# Altium footprint library c3_PcbLib.PcbLib: 222 footprints (part 10 of 14)
Each footprint in its own frame and in the unit in brackets; x right, y up, seen from the top. Pads: shape width x height; smd on the part's side, far side on the other; paste and mask are expansions set on the pad; w line width, h text height; cw(c..) or ccw(c..) is an arc to the next point about the centre after c.
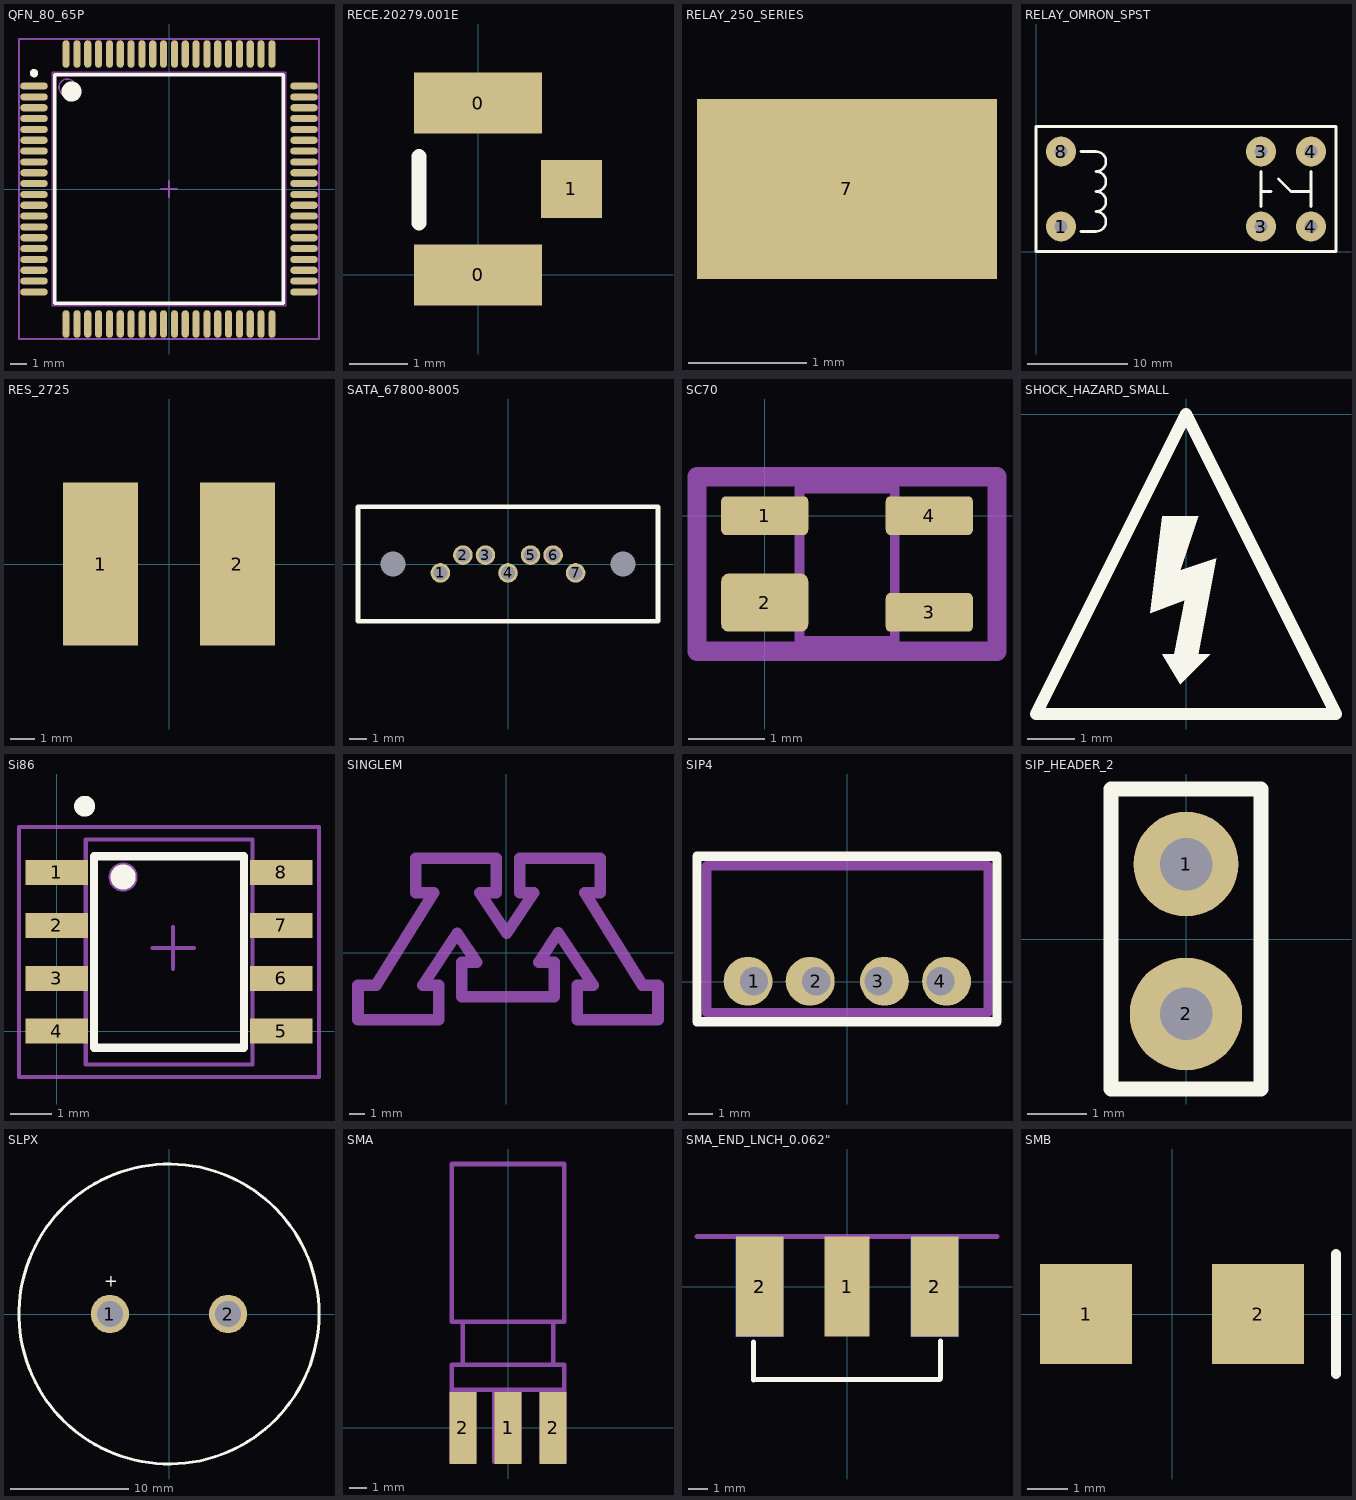
[diagram p9: the footprints below, top view; thin cyan lines are the x and y axes]

## QFN_80_65P [mm]
pads (80):
  oval 1.651x0.432 smd: 1(-8.1,6.175) 2(-8.1,5.525) 3(-8.1,4.875) 4(-8.1,4.225) 5(-8.1,3.575) 6(-8.1,2.925) 7(-8.1,2.275) 8(-8.1,1.625) 9(-8.1,0.975) 10(-8.1,0.325) 11(-8.1,-0.325) 12(-8.1,-0.975) 13(-8.1,-1.625) 14(-8.1,-2.275) 15(-8.1,-2.925) 16(-8.1,-3.575) 17(-8.1,-4.225) 18(-8.1,-4.875) 19(-8.1,-5.525) 20(-8.1,-6.175) 41(8.1,-6.175) 42(8.1,-5.525) 43(8.1,-4.875) 44(8.1,-4.225) 45(8.1,-3.575) 46(8.1,-2.925) 47(8.1,-2.275) 48(8.1,-1.625) 49(8.1,-0.975) 50(8.1,-0.325) 51(8.1,0.325) 52(8.1,0.975) 53(8.1,1.625) 54(8.1,2.275) 55(8.1,2.925) 56(8.1,3.575) 57(8.1,4.225) 58(8.1,4.875) 59(8.1,5.525) 60(8.1,6.175)
  oval 0.432x1.651 smd: 21(-6.175,-8.1) 22(-5.525,-8.1) 23(-4.875,-8.1) 24(-4.225,-8.1) 25(-3.575,-8.1) 26(-2.925,-8.1) 27(-2.275,-8.1) 28(-1.625,-8.1) 29(-0.975,-8.1) 30(-0.325,-8.1) 31(0.325,-8.1) 32(0.975,-8.1) 33(1.625,-8.1) 34(2.275,-8.1) 35(2.925,-8.1) 36(3.575,-8.1) 37(4.225,-8.1) 38(4.875,-8.1) 39(5.525,-8.1) 40(6.175,-8.1) 61(6.175,8.1) 62(5.525,8.1) 63(4.875,8.1) 64(4.225,8.1) 65(3.575,8.1) 66(2.925,8.1) 67(2.275,8.1) 68(1.625,8.1) 69(0.975,8.1) 70(0.325,8.1) 71(-0.325,8.1) 72(-0.975,8.1) 73(-1.625,8.1) 74(-2.275,8.1) 75(-2.925,8.1) 76(-3.575,8.1) 77(-4.225,8.1) 78(-4.875,8.1) 79(-5.525,8.1) 80(-6.175,8.1)
Top Overlay:
  circle w0.6: c-5.85,5.85 r0.3
  circle w0.25: c-8.1,6.95 r0.125
  lines w0.2: -6.85,-6.85 6.85,-6.85 6.85,6.85 -6.85,6.85 -6.85,-6.85
Mechanical 13:
  circle w0.1: c-6.1,6.1 r0.5
  lines w0.1: -7,-7 7,-7 7,7 -7,7 -7,-7
Mechanical 15:
  lines w0.1: -0.5,0 0.5,0 ; 0,-0.5 0,0.5 ; -9,-9 9,-9 9,9 -9,9 -9,-9
3D body: height 2.45, standoff 0, extent -7,-7 7,7

## RECE.20279.001E [mm] "U.FL Connector Footprint"
height 1.25
pads (3):
  rect 2.2x1.05 smd: 0(0,0) 0(0,2.95)
  rect 1.05x1 smd: 1(1.6,1.475)
Top Overlay:
  lines w0.254: -1.016,0.889 -1.016,2.032

## RELAY_250_SERIES [mil] "FOR HG2-DC12V"
pads (1):
  rect 100x60 smd: 7(-136,212)
via -11,371 diameter 50 hole 28
via 171,369 diameter 50 hole 28
via 176,193 diameter 50 hole 28
via 2,190 diameter 50 hole 28
via 3,87 diameter 50 hole 28
via 175,83 diameter 50 hole 28
via 174,4 diameter 50 hole 28
via 2,4 diameter 50 hole 28

## RELAY_OMRON_SPST [mm]
height 15.7
pads (6):
  round 3 hole 1.3: 1(2.5,2.5) 3(22.5,2.5) 3(22.5,10) 4(27.5,2.5) 4(27.5,10) 8(2.5,10)
Top Overlay:
  lines w0.254: 4.5,2 6,2 ccw(c6,3) 6,4 ccw(c6,5) 6,6 ccw(c6,7) 6,8 ccw(c6,9) 6,10 4.5,10 ; 22.5,4.5 22.5,8 ; 22.5,6 23.5,6 ; 24.25,7.25 25.5,6 27.5,6 ; 27.5,4.5 27.5,8 ; 0,0 30,0 30,12.5 0,12.5 0,0

## RES_2725 [mil]
pads (2):
  rect 120x260 smd: 1(-109,0) 2(109,0)

## SATA_67800-8005 [mm]
pads (9):
  round 0 hole 1.4: 0(-6.48,0) 0(6.48,0)
  round 1.1 hole 0.8: 1(-3.81,-0.5) 2(-2.54,0.5) 3(-1.27,0.5) 4(0,-0.5) 5(1.27,0.5) 6(2.54,0.5) 7(3.81,-0.5)
Top Overlay:
  lines w0.254: -8.45,-3.225 8.45,-3.225 8.45,3.225 -8.45,3.225 -8.45,-3.225

## SC70 [mil]
pads (4):
  rrect25% 45x20 smd: 1(0,0) 3(85,-50) 4(85,0)
  rrect25% 45x30 smd: 2(0,-45)
Mechanical 13:
  lines w5: 18,-64.74 18,14 67.21,14 67.21,-64.74 18,-64.74
Mechanical 15:
  lines w10: -35,-70 -35,20 120,20 120,-70 -35,-70
3D body: height 42.69, standoff -0.62, extent -1,-64.37 85.61,14.37

## SHOCK_HAZARD_SMALL [mm]
Top Overlay:
  region: -0.508,-2.159 -0.762,-4.216 -0.025,-3.937 -0.254,-5.08 -0.508,-5.08 -0.127,-5.715 0.508,-5.08 0.254,-5.08 0.635,-3.048 -0.127,-3.302 0.254,-2.159
  lines w0.254: -3.175,-6.35 0,0 3.175,-6.35 -3.175,-6.35

## Si86 [mm]
height 1.5
pads (8):
  rect 1.5x0.6 smd: 1(0,3.81) 2(0,2.54) 3(0,1.27) 4(0,0) 5(5.4,0) 6(5.4,1.27) 7(5.4,2.54) 8(5.4,3.81)
Top Overlay:
  circle w0.25: c0.675,5.4 r0.125
  circle w0.3: c1.6,3.7 r0.15
  lines w0.2: 0.9,-0.4 0.9,4.2 4.5,4.2 4.5,-0.4 0.9,-0.4
Mechanical 13:
  circle w0.1: c1.6,3.7 r0.3
  lines w0.1: 0.7,-0.8 0.7,4.6 4.7,4.6 4.7,-0.8 0.7,-0.8
Mechanical 15:
  lines w0.1: 2.3,2 3.3,2 ; 2.8,1.5 2.8,2.5 ; -0.9,-1.1 -0.9,4.9 6.3,4.9 6.3,-1.1 -0.9,-1.1
3D body: height 1.5, standoff 0.2, extent 0.7,-0.8 4.7,4.6

## SINGLEM [mm]
Top Solder:
  lines w0.762: -9.779,-4.42 -9.779,-2.134 -8.588,-2.134 -4.778,3.962 -5.969,3.962 -5.969,6.248 -0.635,6.248 -0.635,3.962 -1.736,3.962 0.042,1.295 1.82,3.962 0.889,3.962 0.889,6.248 6.223,6.248 6.223,3.962 5.191,3.962 9.001,-2.134 10.033,-2.134 10.033,-4.42 4.699,-4.42 4.699,-2.134 5.757,-2.134 3.45,1.327 2.159,-0.61 3.175,-0.61 3.175,-2.896 -2.921,-2.896 -2.921,-0.61 -1.947,-0.61 -3.217,1.295 -5.503,-2.134 -4.445,-2.134 -4.445,-4.42 -9.779,-4.42

## SIP4 [mm]
pads (4):
  round 2 hole 1.15 copper offset -0.25,0: 1(-3.81,0.025) 2(-1.27,0.025)
  round 2 hole 1.15 copper offset 0.25,0: 3(1.27,0.025) 4(3.81,0.025)
Top Overlay:
  lines w0.381: -6.147,-1.626 -6.147,5.131 6.121,5.131 6.121,-1.626 -6.147,-1.626
Mechanical 15:
  lines w0.381: -5.75,-1.25 -5.75,4.75 5.75,4.75 5.75,-1.25 -5.75,-1.25
3D body: height 10, standoff 0, extent -5.74,-1.245 5.74,4.75

## SIP_HEADER_2 [mil] "2 Pin SIP Header"
pads (2):
  round 70 hole 35: 1(0,50)
  round 75 hole 35: 2(0,-50)
Top Overlay:
  lines w10: -50,-100 -50,100 50,100 50,-100 -50,-100
3D body: height 170.28, standoff -118.11, extent -49,-99.5 276.59,100.5

## SLPX [mm]
pads (2):
  round 3.25 hole 2.2: 1(-5,0) 2(5,0)
Top Overlay:
  circle w0.254: c0,0 r12.7
  text "+" at -5.5,2.3 h1.02

## SMA [mil]
pads (4):
  rect 60x160 smd: 1(0,0) 1(0,0) 2(-100,0) 2(100,0)
Mechanical 1:
  lines w10: -100,140 -100,235 ; -75,85 -75,-75 -125,-75 -125,85 ; -30,85 -30,-75 25,-75 25,85 ; 75,85 75,-75 125,-75 125,85 ; 100,140 100,235 ; -125,85 -125,140 125,140 125,85 ; -125,85 125,85 ; -100,235 -125,235 -125,585 125,585 125,235 100,235 ; -100,235 100,235
3D body: height 30, standoff 0, extent -29.98,-74.98 24.98,84.98
3D body: height 40, standoff -110, extent 75.02,-74.98 124.98,84.98
3D body: height 40, standoff -110, extent -124.98,-74.98 -75.02,84.98
3D body: height 140, standoff -110, extent -124.98,85.02 124.98,139.98
3D body: height 120, standoff -90, extent -99.98,140.02 99.98,234.98
3D body: height 140, standoff -110, extent -124.98,235.02 124.98,584.98

## SMA_END_LNCH_0.062" [mil] "End Launch SMA CXN for 0.062\" boards"
pads (5):
  rect 90x200 smd: 1(0,0)
  rect 95x200 smd: 2(-175,0) 2(175,0)
  rect 95x200 smd far side: 2(-175,0) 2(175,0)
Top Overlay:
  lines w10: -187.5,-111 -187.5,-186.5 -187,-186 185,-186 187,-184 187,-119 ; 187,-123 187,-109
Bottom Overlay:
  lines w10: -240,90 -240,-200 -230,-210 230,-210 240,-200 240,90 ; -187,-188 -187,-109 ; -185,-188 185,-188 187,-186 187,-108
Mechanical 1:
  lines w10: -300,100 300,100
3D body: height 170.51, standoff -141.3, extent -190,-80 184.8,481.81

## SMB [mm]
pads (2):
  rect 2.3x2.5 smd: 1(-2.15,0) 2(2.15,0)
Top Overlay:
  lines w0.254: 4.1,-1.5 4.1,1.5